# Altium schematic symbol library Schlib.SchLib: 725 symbols (part 5 of 6) (continued)
## S14B-XADSS-N(LF)(SN)
designator J?  (value not drawn)
ShroudedHeader, Side Entry, 14Circuit, 2.5mmPitch; Manufacturer: JST; Manufacturer Part Number: S14B-XADSS-N(LF)(SN); Number of Positions: 14; Connector Type: Header; Voltage Rating: 250V; Supplier: Digi-Key; Supplier Part Number: 455-2034-ND; RoHS: Yes; Category: Headers and Wire Housings; Pricing: 1=1.94, 10=1.69, 100=1.5104, 500=1.25864, 1000=1.07883, 5000=0.95656, 10000=0.93499 (USD); Mounting Technology: Through Hole; Contact Material: Copper Alloy; Contact Shape: Circular; Contact Finish - Mating: TIN; Insulation Material: Nylon; Insulation Color: Natural; Min Operating Temperature: -25°C; Max Operating Temperature: 85°C; Number of Rows: 2; Fastening Type: Ramp; Packaging: Bulk; Termination: Solder; Series: XAD; Contact Type: Male Pin; Flammability Rating: UL94 V-0; ComponentLink1URL: https://datasheet.ciiva.com/726/exad1-726146.pdf?src-supplier=Digi-Key; ComponentLink1Description: https://datasheet.ciiva.com/726/exad1-726146.pdf?src-supplier=Digi-Key
footprint S14B-XADSS-N
pins: 1, 2, 3, 4, 5, 6, 7, 8, 9, 10, 11, 12, 13, 14

## SBRT5A50SA-13
designator D?  (value not drawn)
Diode Super Barrier Rectifier 50V 5A 2-Pin SMA T/R; Manufacturer: Diodes; Manufacturer Part Number: SBRT5A50SA-13; Forward Voltage: 460mV; Max Forward Surge Current (Ifsm): 70A; Max Reverse Current: 45mA; Supplier: Future Electronics; Supplier Part Number: 2052284; RoHS: Yes; Category: Rectifier Diodes; Stock: 310000; Pricing: 5000=0.114, 10000=0.112, 15000=0.11, 20000=0.109 (USD); Mounting Technology: Surface Mount; Case/Package: SMA; Weight: 0.002258oz; Min Operating Temperature: -55°C; Max Operating Temperature: 150°C; Packaging: Tape and Reel; Average Rectified Current: 5A; Max Repetitive Reverse Voltage (Vrrm): 50V; Package Quantity: 5000; Max Reverse Voltage (DC): 50V; Series: TrenchSBR; Forward Current: 5A; Height: 2.4mm; Lead Free: Lead Free; RoHS Compliant: Yes; ComponentLink1URL: http://www.farnell.com/datasheets/2814462.pdf?src-supplier=Farnell; ComponentLink1Description: http://www.farnell.com/datasheets/2814462.pdf?src-supplier=Farnell; ComponentLink2URL: https://www.diodes.com/assets/Datasheets/SBRT5A50SA.pdf?src-supplier=Digikey; ComponentLink2Description: https://www.diodes.com/assets/Datasheets/SBRT5A50SA.pdf?src-supplier=Digikey; ComponentLink3URL: http://www.farnell.com/datasheets/2814462.pdf?src-supplier=Newark; ComponentLink3Description: http://www.farnell.com/datasheets/2814462.pdf?src-supplier=Newark; ComponentLink4URL: https://datasheet.octopart.com/SBRT5A50SA-13-Diodes-Inc.-datasheet-141417846.pdf?src-supplier=Future+Electronics; ComponentLink4Description: https://datasheet.octopart.com/SBRT5A50SA-13-Diodes-Inc.-datasheet-141417846.pdf?src-supplier=Future+Electronics; ComponentLink5URL: http://www.farnell.com/datasheets/2814462.pdf?src-supplier=Element14; ComponentLink5Description: http://www.farnell.com/datasheets/2814462.pdf?src-supplier=Element14; ComponentLink6URL: https://www.diodes.com/assets/Datasheets/SBRT5A50SA.pdf?src-supplier=Mouser; ComponentLink6Description: https://www.diodes.com/assets/Datasheets/SBRT5A50SA.pdf?src-supplier=Mouser; ComponentLink7URL: https://www.diodes.com/assets/Datasheets/SBRT5A50SA.pdf?src-supplier=Avnet; ComponentLink7Description: https://www.diodes.com/assets/Datasheets/SBRT5A50SA.pdf?src-supplier=Avnet; ComponentLink8URL: https://www.diodes.com/assets/Datasheets/SBRT5A50SA.pdf?src-supplier=Arrow+Electronics; ComponentLink8Description: https://www.diodes.com/assets/Datasheets/SBRT5A50SA.pdf?src-supplier=Arrow+Electronics; ComponentLink9URL: https://www.diodes.com/assets/Datasheets/SBRT5A50SA.pdf?src-supplier=Verical; ComponentLink9Description: https://www.diodes.com/assets/Datasheets/SBRT5A50SA.pdf?src-supplier=Verical
footprint DO-214AC, SMA
pins: 1 C, 2 A

## SESD0402X1UN-0020-090
designator D?
Part Number: SESD0402X1UN-0020-090
footprint SESD0402X1UN-0020-090
pins: A, C

## SFW15R-1STE1LF
designator J?  (value not drawn)
Conn FFC/FPC Connector SKT 15 POS 1mm Solder RA SMD Embossed T/R; Manufacturer: Amphenol ICC / FCI; Manufacturer Part Number: SFW15R-1STE1LF; Supplier: Newark; Supplier Part Number: 29AK7264; RoHS: No; Category: FFC / FPC; ComponentLink1URL: http://portal.fciconnect.com/Comergent/fci/drawing/sfw12lf.pdf?src-supplier=Mouser; ComponentLink1Description: http://portal.fciconnect.com/Comergent/fci/drawing/sfw12lf.pdf?src-supplier=Mouser; ComponentLink2URL: http://components.arrow.com/part/dataview/41915029S8554886N8314?src-supplier=Arrow+Electronics; ComponentLink2Description: http://components.arrow.com/part/dataview/41915029S8554886N8314?src-supplier=Arrow+Electronics; ComponentLink3URL: https://cdn.amphenol-icc.com/media/wysiwyg/files/drawing/sfw12lf.pdf?src-supplier=Digi-Key; ComponentLink3Description: https://cdn.amphenol-icc.com/media/wysiwyg/files/drawing/sfw12lf.pdf?src-supplier=Digi-Key; ComponentLink4URL: http://portal.fciconnect.com/Comergent//fci/drawing/sfw12lf.pdf?src-supplier=Digi-Key; ComponentLink4Description: http://portal.fciconnect.com/Comergent//fci/drawing/sfw12lf.pdf?src-supplier=Digi-Key; ComponentLink5URL: http://portal.fciconnect.com/Comergent/fci/drawing/sfw12lf.pdf?src-supplier=Avnet; ComponentLink5Description: http://portal.fciconnect.com/Comergent/fci/drawing/sfw12lf.pdf?src-supplier=Avnet
footprint SFW15R-1STE1LF
pins: 1, 2, 3, 4, 5, 6, 7, 8, 9, 10, 11, 12, 13, 14, 15, S1 SHIELD, S2 SHIELD

## SI1024X-T1-GE3
designator Q?  (value not drawn)
Transistor MOSFET Array Dual N-CH 20V 485mA 6-Pin SOT-563 T/R; Manufacturer: Vishay Siliconix; Manufacturer Part Number: SI1024X-T1-GE3; Rds On Max: 700mR; Max Power Dissipation: 250mW; Gate to Source Voltage (Vgs): 6V; Number of Elements: 2; Threshold Voltage: 450mV; Number of Channels: 1; FET Type: 2 N-Channel; Polarity: N-CHANNEL; Supplier: Digi-Key; Supplier Part Number: SI1024X-T1-GE3CT-ND; RoHS: Yes; Category: MOSFETs; Stock: 159002; Pricing: 1=0.55000, 10=0.47200, 100=0.35280, 500=0.27720, 1000=0.21420 (USD); Mounting Technology: Surface Mount; Case/Package: SOT-563-6; Pins: 89; Weight: 0.000289oz; Contact Plating: Tin,Matte; Min Operating Temperature: -55°C; Max Operating Temperature: 150°C; Package Quantity: 3000; Packaging: Tape and Reel; Drain to Source Voltage (Vdss): 20V; Continuous Drain Current (ID): 485mA; Drain to Source Breakdown Voltage: 20V; Drain to Source Resistance: 700mR; Power Dissipation: 250mW; Element Configuration: Dual; On-State Resistance: 700mR; Series: TrenchFET®; Drain-source On Resistance-Max: 700mR; Length: 1.7mm; Width: 1.2mm; Height: 0.6mm; Radiation Hardening: No; Lead Free: Lead Free; RoHS Compliant: Yes; ComponentLink1URL: https://datasheet.ciiva.com/1253/71170-1253313.pdf?src-supplier=Newark; ComponentLink1Description: https://datasheet.ciiva.com/1253/71170-1253313.pdf?src-supplier=Newark; ComponentLink2URL: https://datasheet.ciiva.com/6388/71170-6388105.pdf?src-supplier=Digi-Key; ComponentLink2Description: https://datasheet.ciiva.com/6388/71170-6388105.pdf?src-supplier=Digi-Key; ComponentLink3URL: https://datasheet.ciiva.com/6388/71170-6388154.pdf?src-supplier=Digi-Key; ComponentLink3Description: https://datasheet.ciiva.com/6388/71170-6388154.pdf?src-supplier=Digi-Key; ComponentLink4URL: https://datasheet.ciiva.com/11161/71170-11161434.pdf?src-supplier=Avnet; ComponentLink4Description: https://datasheet.ciiva.com/11161/71170-11161434.pdf?src-supplier=Avnet; ComponentLink5URL: https://datasheet.ciiva.com/6388/71170-6388155.pdf?src-supplier=Digi-Key; ComponentLink5Description: https://datasheet.ciiva.com/6388/71170-6388155.pdf?src-supplier=Digi-Key
footprint SC-89 (SOT-563F)
pins: 1 S1, 2 G1, 3 D2, 4 S2, 5 G2, 6 D1

## SI7611DN-T1-GE3
designator Q?  (value not drawn)
P-Channel 40 V 0.025 Ohm 39 W Surface Mount Power Mosfet - PowerPAK-1212-8; Manufacturer: Vishay Siliconix; Manufacturer Part Number: SI7611DN-T1-GE3; Supplier: Digikey; Supplier Part Number: SI7611DN-T1-GE3CT-ND; RoHS: Yes; Category: MOSFETs; Stock: 9291; Pricing: 1=2.37, 10=1.521, 100=1.0368, 500=0.82974, 1000=0.76314 (USD); ComponentLink1URL: https://datasheet.ciiva.com/4441/si7611dn-244617-4441134.pdf?src-supplier=Mouser; ComponentLink1Description: https://datasheet.ciiva.com/4441/si7611dn-244617-4441134.pdf?src-supplier=Mouser; ComponentLink2URL: https://datasheet.ciiva.com/22652/1719651-22652413.pdf?src-supplier=Element14; ComponentLink2Description: https://datasheet.ciiva.com/22652/1719651-22652413.pdf?src-supplier=Element14; ComponentLink3URL: https://datasheet.ciiva.com/16217/si7611dn-16217425.pdf?src-supplier=Future+Electronics; ComponentLink3Description: https://datasheet.ciiva.com/16217/si7611dn-16217425.pdf?src-supplier=Future+Electronics; ComponentLink4URL: https://datasheet.ciiva.com/22671/si7611dn-22671641.pdf?src-supplier=Element14; ComponentLink4Description: https://datasheet.ciiva.com/22671/si7611dn-22671641.pdf?src-supplier=Element14; ComponentLink5URL: https://datasheet.ciiva.com/933/si7611dn-933572.pdf?src-supplier=Digikey; ComponentLink5Description: https://datasheet.ciiva.com/933/si7611dn-933572.pdf?src-supplier=Digikey; ComponentLink6URL: https://datasheet.ciiva.com/933/si7611dn-933573.pdf?src-supplier=Digikey; ComponentLink6Description: https://datasheet.ciiva.com/933/si7611dn-933573.pdf?src-supplier=Digikey; ComponentLink7URL: https://datasheet.ciiva.com/933/si7611dn-933574.pdf?src-supplier=Digikey; ComponentLink7Description: https://datasheet.ciiva.com/933/si7611dn-933574.pdf?src-supplier=Digikey; ComponentLink8URL: https://datasheet.ciiva.com/11159/si7611dn-11159816.pdf?src-supplier=Avnet; ComponentLink8Description: https://datasheet.ciiva.com/11159/si7611dn-11159816.pdf?src-supplier=Avnet
footprint PowerPAK 1212-8
pins: 1 S, 2 S, 3 S, 4 G, 5 D, 6 D, 7 D, 8 D

## SI7617DN-T1-GE3
designator Q?  (value not drawn)
P CHANNEL MOSFET, -30V, 35A; Transistor; Transistor Polarity: P Channel; Continuous Drain Current Id: -35A; Source; Manufacturer: Vishay Siliconix; Manufacturer Part Number: SI7617DN-T1-GE3; Rise Time: 43ns; Rds On Max: 12.3mR; Input Capacitance: 1.8nF; Gate to Source Voltage (Vgs): 25V; Max Power Dissipation: 52W; Fall Time: 11ns; Turn-Off Delay Time: 30ns; Number of Elements: 1; Power Dissipation: 3.7W; Threshold Voltage: -2.5V; Turn-On Delay Time: 40ns; Polarity: P-CHANNEL; Supplier: Mouser; Supplier Part Number: 781-SI7617DN-GE3; RoHS: Yes; Category: MOSFETs; Stock: 19113; Pricing: 1=0.85, 10=0.695, 50=0.695, 100=0.541, 1000=0.374, 10000=0.32 (USD); Mounting Technology: Surface Mount; Pins: 8; Min Operating Temperature: -55°C; Max Operating Temperature: 150°C; Packaging: Tape and Reel; Package Quantity: 3000; Drain to Source Resistance: 12.3mR; Drain to Source Voltage (Vdss): -30V; Continuous Drain Current (ID): -35A; Number of Channels: 1; Series: TrenchFET®; Radiation Hardening: No; Reach SVHC Compliant: No; Lead Free: Lead Free; RoHS Compliant: Yes; ComponentLink1URL: https://datasheet.ciiva.com/11159/si7617dn-11159822.pdf?src-supplier=Avnet; ComponentLink1Description: https://datasheet.ciiva.com/11159/si7617dn-11159822.pdf?src-supplier=Avnet
footprint SI7617DN-T1-GE3
pins: 1 S, 2 S, 3 S, 4 G, 5 D

## SIC438BED-T1-GE3
designator U?  (value not drawn)
Synchronous Buck Regulator Power Saving 28V I/P Adjustable O/P 8A 24-Pin PowerPAK MLP44 T/R; Manufacturer: Vishay Siliconix; Manufacturer Part Number: SIC438BED-T1-GE3; Output Configuration: Positive; Number of Outputs: 1; Min Input Voltage: 3V; Min Output Voltage: 600mV; Max Output Voltage: 20V; Switching Frequency: 1MHz; Synchronous Rectifier: Yes; Supplier: Digi-Key; Supplier Part Number: SIC438BED-T1-GE3CT-ND; RoHS: Yes; Category: Voltage Regulators - Switching; Stock: 19616; Pricing: 1=2.88000, 10=2.58400, 25=2.43800, 100=2.07720, 250=1.95040, 500=1.70660, 1000=1.51800 (USD); Mounting Technology: Surface Mount; Pins: 24; Min Operating Temperature: -40°C; Max Operating Temperature: 125°C; Output Type: Adjustable; Packaging: Cut Tape; Max Supply Voltage: 28V; Output Current: 8A; ComponentLink1URL: http://www.vishay.com/docs/75921/sic437.pdf?src-supplier=Digi-Key; ComponentLink1Description: http://www.vishay.com/docs/75921/sic437.pdf?src-supplier=Digi-Key
footprint SIC438BED-T1-GE3
pins: 1 VIN, 2 VIN, 3 PGND, 4 PGND, 5 SW, 6 SW, 7 SW, 8 SW, 9 SW, 10 GL, 11 GL, 12 VDRV, 13 PGND, 14 PGOOD, 15 VDD, 16 AGND, 17 FB, 18 VOUT, 19 EN, 20 MODE2, 21 MODE1, 22 VIN, 23 BOOT, 24 PHASE, 25 AGND_PAD, 26 VIN_PAD, 27 PGND_PAD, 28 GL, 29 PGND_PAD, 30 SW

## SIC461ED-T1-GE3
designator U?  (value not drawn)
Synchronous Buck Regulator 10 A 2 MHz 4.5 V to 60 V I/P Adjustable 0.8 V to 55.2 V O/P PowerPAK MLP 55-27L; Manufacturer: Vishay; Manufacturer Part Number: SIC461ED-T1-GE3; Output Configuration: Positive; Number of Outputs: 1; Min Input Voltage: 4.5V; Max Supply Voltage: 60V; Min Output Voltage: 800mV; Max Output Voltage: 55.2V; Output Current: 10A; Switching Frequency: 2MHz; Synchronous Rectifier: Yes; Supplier: Mouser; Supplier Part Number: 78-SIC461ED-T1-GE3; RoHS: Yes; Category: Voltage Regulators - Switching; Stock: 11112; Pricing: 1=5.36, 10=4.55, 50=4.55, 100=3.95, 1000=2.83, 10000=2.65 (USD); Mounting Technology: Surface Mount; Min Operating Temperature: -40°C; Max Operating Temperature: 125°C; Output Type: Adjustable; Packaging: Cut Tape; Series: -; RoHS Compliant: Yes; ComponentLink1URL: http://www.vishay.com/docs/65124/sic46x.pdf?src-supplier=Digikey; ComponentLink1Description: http://www.vishay.com/docs/65124/sic46x.pdf?src-supplier=Digikey
pins: 1 VCIN, 2 PGOOD, 3 EN, 4 BOOT, 5 PHASE, 6 PHASE, 7 VIN, 8 VIN, 9 PGND, 10 PGND, 11 PGND, 12 SW, 13 SW, 14 SW, 14.1 SW, 15 GL, 16 VDRV, 17 PGND, 18 ULTRASONIC, 19 SS, 20 VSNS, 21 COMP, 22 VFB, 23 AGND, 24 FSW, 25 ILIMIT, 26 VDD, 27 MODE, 28 AGND, 29 VIN, 30.1 PGND, 30.2 PGND

## SIC466ED-T1-GE3
designator *
4.5 - 60V input, 10A microBUCK with Internal compensation, 120 A quiescent current; Manufacturer: Vishay; Manufacturer Part Number: SIC466ED-T1-GE3; Output Type: Adjustable; Output Configuration: Positive; Number of Outputs: 1; Min Input Voltage: 4.5V; Min Output Voltage: 800mV; Max Output Voltage: 55.2V; Switching Frequency: 2MHz; Synchronous Rectifier: Yes; Supplier: Mouser; Supplier Part Number: 78-SIC466ED-T1-GE3; RoHS: Yes; Category: DSPs - Digital Signal Processors; Stock: 4498; Pricing: 1=5.88, 10=5, 50=5, 100=4.33, 1000=3.11, 10000=2.85 (USD); Mounting Technology: Surface Mount; Min Operating Temperature: -40°C; Max Operating Temperature: 105°C; Series: microBUCK®; Packaging: Cut Tape; Max Supply Voltage: 60V; Output Current: 10A; RoHS Compliant: Yes; ComponentLink1URL: https://datasheet.octopart.com/SIC466ED-T1-GE3-Vishay-datasheet-156007658.pdf?src-supplier=Future+Electronics; ComponentLink1Description: https://datasheet.octopart.com/SIC466ED-T1-GE3-Vishay-datasheet-156007658.pdf?src-supplier=Future+Electronics; ComponentLink2URL: http://www.vishay.com/docs/76044/sic46x.pdf?src-supplier=Digikey; ComponentLink2Description: http://www.vishay.com/docs/76044/sic46x.pdf?src-supplier=Digikey

## SIP32408DNP-T1-GE4
designator U?  (value not drawn)
SWITCH, SLEW CNTRL, 5.5V, 3.5A, 4TDFN; Power Load Switch Type: High Side; Input V; Manufacturer: Vishay Siliconix; Manufacturer Part Number: SIP32408DNP-T1-GE4; Number of Outputs: 1; Max Power Dissipation: 735mW; Min Supply Voltage: 1.1V; Interface: On/Off; On-State Resistance: 44mR; Fault Protection: Reverse Current; Supplier: Mouser; Supplier Part Number: 78-SIP32408DNP-GE4; RoHS: Yes; Category: Hot Swap Controllers; Stock: 31306; Pricing: 1=0.61, 10=0.488, 50=0.488, 100=0.363, 1000=0.237, 10000=0.188 (USD); Mounting Technology: Surface Mount; Pins: 4; Weight: 0.001764oz; Min Operating Temperature: -40°C; Max Operating Temperature: 85°C; Package Quantity: 3000; Packaging: Tape and Reel; Output Current: 3.5A; Max Supply Voltage: 5.5V; Max Output current: 3.5A; Power Dissipation: 735mW; Output Configuration: High Side; Series: -; Lead Free: Lead Free; RoHS Compliant: Yes; Reach SVHC Compliant: Unknown; ComponentLink1URL: https://datasheet.ciiva.com/22629/1692703-22629056.pdf?src-supplier=Element14; ComponentLink1Description: https://datasheet.ciiva.com/22629/1692703-22629056.pdf?src-supplier=Element14; ComponentLink2URL: https://datasheet.ciiva.com/12186/sip32408-244424-12186651.pdf?src-supplier=Mouser; ComponentLink2Description: https://datasheet.ciiva.com/12186/sip32408-244424-12186651.pdf?src-supplier=Mouser
footprint SIP32408DNP-T1-GE4
pins: 1 IN, 2 GND, 3 EN, 4 OUT, 5 GND

## SIS412DN-T1-GE3
designator Q?  (value not drawn)
SiS412DN Series N-Channel 30 V 24 mOhms SMT Power Mosfet - PowerPAK-1212-8; Manufacturer: Vishay Siliconix; Manufacturer Part Number: SIS412DN-T1-GE3; Rise Time: 12ns; Rds On Max: 24mR; Input Capacitance: 435pF; Nominal Vgs: 1V; Drain to Source Voltage (Vdss): 30V; Continuous Drain Current (ID): 12A; Max Power Dissipation: 15.6W; Gate to Source Voltage (Vgs): 20V; Fall Time: 10ns; Turn-Off Delay Time: 15ns; Number of Channels: 1; Supplier: Mouser; Supplier Part Number: 781-SIS412DN-T1-GE3; RoHS: Yes; Category: MOSFETs; Stock: 10524; Pricing: 1=0.57, 10=0.492, 50=0.492, 100=0.358, 1000=0.243, 10000=0.215 (USD); Mounting Technology: Surface Mount; Pins: 8; Min Operating Temperature: -55°C; Max Operating Temperature: 150°C; Package Quantity: 1; Packaging: Tape and Reel; Drain to Source Resistance: 24mR; Threshold Voltage: 1V; Turn-On Delay Time: 15ns; Polarity: N-CHANNEL; Series: TrenchFET®; Drain-source On Resistance-Max: 24MR; Length: 3.05mm; Width: 3.05mm; Height: 1.04mm; Radiation Hardening: No; Lead Free: Lead Free; RoHS Compliant: Yes; Reach SVHC Compliant: Unknown; ComponentLink1URL: https://datasheet.ciiva.com/6367/sis412dn-6367073.pdf?src-supplier=Digikey; ComponentLink1Description: https://datasheet.ciiva.com/6367/sis412dn-6367073.pdf?src-supplier=Digikey; ComponentLink2URL: https://datasheet.ciiva.com/23729/1758800-23729781.pdf?src-supplier=Newark; ComponentLink2Description: https://datasheet.ciiva.com/23729/1758800-23729781.pdf?src-supplier=Newark; ComponentLink3URL: https://datasheet.ciiva.com/8059/sis412dn-8059196.pdf?src-supplier=Element14; ComponentLink3Description: https://datasheet.ciiva.com/8059/sis412dn-8059196.pdf?src-supplier=Element14; ComponentLink4URL: https://datasheet.ciiva.com/16486/sis412dn-16486863.pdf?src-supplier=Future+Electronics; ComponentLink4Description: https://datasheet.ciiva.com/16486/sis412dn-16486863.pdf?src-supplier=Future+Electronics; ComponentLink5URL: https://datasheet.ciiva.com/6367/sis412dn-6367070.pdf?src-supplier=Digikey; ComponentLink5Description: https://datasheet.ciiva.com/6367/sis412dn-6367070.pdf?src-supplier=Digikey; ComponentLink6URL: https://datasheet.ciiva.com/6367/sis412dn-6367077.pdf?src-supplier=Digikey; ComponentLink6Description: https://datasheet.ciiva.com/6367/sis412dn-6367077.pdf?src-supplier=Digikey
footprint SIS412DN-T1-GE3
pins: 1 S, 2 S, 3 S, 4 G, 5 D

## SK34A
designator D?  (value not drawn)
Rectifier, Schottky, 3A, 40V, DO-214AC (SMA); Manufacturer: Taiwan Semiconductor; Manufacturer Part Number: SK34A; Element Configuration: Single; Forward Voltage: 550mV; Max Forward Surge Current (Ifsm): 70A; Max Reverse Leakage Current: 500uA; Supplier: Mouser; Supplier Part Number: 821-SK34A; RoHS: Yes; Category: Uncategorized; Stock: 11617; Pricing: 1=0.42000, 10=0.34000, 50=0.34000, 100=0.27300, 1000=0.27300, 10000=0.11700 (USD); Case/Package: SMA; Pins: 2; Min Operating Temperature: -55°C; Max Operating Temperature: 125°C; Packaging: Tape and Reel; Max Repetitive Reverse Voltage (Vrrm): 40V; Forward Current: 3A; Package Quantity: 7500; Max Surge Current: 70A; RoHS Compliant: Yes; Reach SVHC Compliant: Yes; ComponentLink1URL: https://datasheet.ciiva.com/5762/51635-5762838.pdf?src-supplier=Farnell; ComponentLink1Description: https://datasheet.ciiva.com/5762/51635-5762838.pdf?src-supplier=Farnell; ComponentLink2URL: https://datasheet.ciiva.com/7962/51635-7962571.pdf?src-supplier=Element14; ComponentLink2Description: https://datasheet.ciiva.com/7962/51635-7962571.pdf?src-supplier=Element14; ComponentLink3URL: https://datasheet.ciiva.com/7962/51635-7962570.pdf?src-supplier=Element14; ComponentLink3Description: https://datasheet.ciiva.com/7962/51635-7962570.pdf?src-supplier=Element14
footprint DO-214AC, SMA
pins: 1 C, 2 A

## SLW-166261-4A-RA-N-D
designator SW?
16.5 x 6.2 x 6.1 mm, 4 mm Raised Slide Actuator, Right Angle, Through Hole, Slide Switch; Manufacturer: Same Sky; Manufacturer Part Number: SLW-166261-4A-RA-N-D; Number of Positions: 3; Supplier: Mouser; Supplier Part Number: 179-SLW1662614ARAND; RoHS: Compliant; Category: Slide Switches; Stock: 3177; Pricing: 1=0.54, 10=0.518, 50=0.499, 100=0.432, 1000=0.348, 10000=0.298 (USD); Export Control Classification Number (ECCN) Code: EAR99; Harmonized Tariff Schedule (HTS) Code: 8536.50.70.00; Introduction Date: 2024-11-07; Lifecycle Status: Production; ComponentLink1URL: https://datasheet.octopart.com:443/SLW-166261-4A-RA-N-D-Same-Sky-datasheet-188843292.pdf?src-supplier=Electro+Sonic; ComponentLink1Description: https://datasheet.octopart.com:443/SLW-166261-4A-RA-N-D-Same-Sky-datasheet-188843292.pdf?src-supplier=Electro+Sonic; ComponentLink2URL: https://datasheet.octopart.com:443/SLW-166261-4A-RA-N-D-Same-Sky-datasheet-192884159.pdf?src-supplier=Farnell; ComponentLink2Description: https://datasheet.octopart.com:443/SLW-166261-4A-RA-N-D-Same-Sky-datasheet-192884159.pdf?src-supplier=Farnell; ComponentLink3URL: https://datasheet.octopart.com:443/SLW-166261-4A-RA-N-D-Same-Sky-datasheet-181919708.pdf?src-supplier=Same+Sky; ComponentLink3Description: https://datasheet.octopart.com:443/SLW-166261-4A-RA-N-D-Same-Sky-datasheet-181919708.pdf?src-supplier=Same+Sky; ComponentLink4URL: https://datasheet.octopart.com:443/SLW-166261-4A-RA-N-D-Same-Sky-datasheet-187907069.pdf?src-supplier=Master+Electronics; ComponentLink4Description: https://datasheet.octopart.com:443/SLW-166261-4A-RA-N-D-Same-Sky-datasheet-187907069.pdf?src-supplier=Master+Electronics; ComponentLink5URL: https://datasheet.octopart.com:443/SLW-166261-4A-RA-N-D-Same-Sky-datasheet-188930918.pdf?src-supplier=TME; ComponentLink5Description: https://datasheet.octopart.com:443/SLW-166261-4A-RA-N-D-Same-Sky-datasheet-188930918.pdf?src-supplier=TME; ComponentLink6URL: https://datasheet.octopart.com:443/SLW-166261-4A-RA-N-D-CUI-Devices-datasheet-179746715.pdf?src-supplier=TME; ComponentLink6Description: https://datasheet.octopart.com:443/SLW-166261-4A-RA-N-D-CUI-Devices-datasheet-179746715.pdf?src-supplier=TME; ComponentLink7URL: https://octopart.com:443/opatz8j6/c1?t=aa_y8OcgiqQrusNSdiFUNPSqHMoNR-mmO6jvzALhgaLK5JgwzTA5kpIZ_BF6SIoAkBHrl7d19WHuT8sybLdudKvKiI-hR0gcjJee-8FcKbbBOYZHoZqOakR3OHMUwDLIKyS-VwI_3HyUIzwM1Ab63uWjLLRVQxXaHQztaKGuyb_sprOcezcZMuVibEkpVVon3vy9x0oOcVNJNkq-XBgKaTY-Vfjn9tBq_eWc6IFpG99pE0flz8w-wNhs3AVGEn3LOm2NE6Up1PQ2lV55f3d16jLE7kGOtc-D26eg4RWuV0X0_yCBkWL_ViIgBu1v8Z7KY2m1ye96B6Q7BCajjy9_LOusT7uCYWaxdRpHF6VQQaP7wAQkmg&src-supplier=Compliance+Statements; ComponentLink7Description: https://octopart.com:443/opatz8j6/c1?t=aa_y8OcgiqQrusNSdiFUNPSqHMoNR-mmO6jvzALhgaLK5JgwzTA5kpIZ_BF6SIoAkBHrl7d19WHuT8sybLdudKvKiI-hR0gcjJee-8FcKbbBOYZHoZqOakR3OHMUwDLIKyS-VwI_3HyUIzwM1Ab63uWjLLRVQxXaHQztaKGuyb_sprOcezcZMuVibEkpVVon3vy9x0oOcVNJNkq-XBgKaTY-Vfjn9tBq_eWc6IFpG99pE0flz8w-wNhs3AVGEn3LOm2NE6Up1PQ2lV55f3d16jLE7kGOtc-D26eg4RWuV0X0_yCBkWL_ViIgBu1v8Z7KY2m1ye96B6Q7BCajjy9_LOusT7uCYWaxdRpHF6VQQaP7wAQkmg&src-supplier=Compliance+Statements; ComponentLink8URL: https://octopart.com:443/opatz8j6/c1?t=YI7t5mNvtuXjDcOstTUyF6OWRrNBAUGuBsGh_GXlLUFA6v8CMP-hei9ZOLKUw6M8nx5WDvOfrdfi63kpw4-zJax7FYh7LXEVy11j_tCrOAw7h2Tz2l8ORNQNLmOmM8IEk6no3WHpO3dGkhoEkZRgFRjw8ayhaABd2RucbTbxLx2AFUM4_docFIwQRNbMrLygTaUnAmWozFATMa4uea5_xuXEa7B9a8KPoRoWVdqXB3tV2LiehXcQb5yuWeBiACWZ7VE35s6WuEDzLFJ8DvVloChu59vNe6i7UWkRUKymQv58iZmBWBlwiR05kGZDHMLxQe9c15x_wZycH3PRNTYe4sLZ8M7BAsTJzklIlHiuIbie5kQ8xw&src-supplier=Compliance+Statements; ComponentLink8Description: https://octopart.com:443/opatz8j6/c1?t=YI7t5mNvtuXjDcOstTUyF6OWRrNBAUGuBsGh_GXlLUFA6v8CMP-hei9ZOLKUw6M8nx5WDvOfrdfi63kpw4-zJax7FYh7LXEVy11j_tCrOAw7h2Tz2l8ORNQNLmOmM8IEk6no3WHpO3dGkhoEkZRgFRjw8ayhaABd2RucbTbxLx2AFUM4_docFIwQRNbMrLygTaUnAmWozFATMa4uea5_xuXEa7B9a8KPoRoWVdqXB3tV2LiehXcQb5yuWeBiACWZ7VE35s6WuEDzLFJ8DvVloChu59vNe6i7UWkRUKymQv58iZmBWBlwiR05kGZDHMLxQe9c15x_wZycH3PRNTYe4sLZ8M7BAsTJzklIlHiuIbie5kQ8xw&src-supplier=Compliance+Statements
footprint SW_SLW-166261-4A-RA-N-D
pins: 1, 2, 3, 4, 5 SH1, 6 SH2

## SM3ZS067U215AMR1500
designator J?  (value not drawn)
Conn Edge Sgl Female 67POS 0.020; Manufacturer: JAE Electronics; Manufacturer Part Number: SM3ZS067U215AMR1500; Supplier: Digi-Key; Supplier Part Number: SM3ZS067U215AMR1500-ND; RoHS: Yes; Category: Card Edge Connectors; Pricing: 2250000=0.95948 (USD); ComponentLink1URL: http://www.jae.com/z-en/pdf_download_exec.cfm?param=MB-0261-4E_SM3.pdf&src-supplier=Digi-Key; ComponentLink1Description: http://www.jae.com/z-en/pdf_download_exec.cfm?param=MB-0261-4E_SM3.pdf&src-supplier=Digi-Key
footprint SM3ZS067U215AMR1500
pins: 1 GND, 2 3V3, 3 GND, 4 3V3, 5 PER3_N, 6 N/C, 7 PER3_P, 8 N/C, 9 GND, 10 LED, 11 PET3_N, 12 3V3, 13 PET3_P, 14 3V3, 15 GND, 16 3V3, 17 PER2_N, 18 3V3, 19 PER2_P, 20 N/C, 21 GND, 22 N/C, 23 PET2_N, 24 N/C, 25 PET2_P, 26 N/C, 27 GND, 28 N/C, 29 PER1_N, 30 N/C, 31 PER1_P, 32 N/C, 33 GND, 34 N/C, 35 PET1_N, 36 N/C, 37 PET1_P, 38 N/C, 39 GND, 40 SMB_CLK, 41 PER0_N, 42 SMB_DATA, 43 PER0_P, 44 ALERT*, 45 GND, 46 N/C, 47 PET0_N, 48 N/C, 49 PET0_P, 50 PERST#, 51 GND, 52 CLKREQ#, 53 REFCLK_N, 54 PEWAK#, 55 REFCLK_P, 56 N/C, 57 GND, 58 N/C, 67 N/C, 68 SUSCLK(32KHz), 69 N/C, 70 3V3, 71 GND, 72 3V3, 73 GND, 74 3V3, 75 GND, S1 MNT1, S2 MNT2
text: M.2 KEY M

## SM04B-GHS-TB(LF)(SN)
designator J?  (value not drawn)
Connector Header, GH Series, 4 Position, 1.25mm, 30-26 AWG, 50V, Surface Mount, Right Angle, Solder, Locking Ramp; Manufacturer: JST; Manufacturer Part Number: SM04B-GHS-TB(LF)(SN); Number of Positions: 4; Current Rating: 1A; Supplier: Rs; Supplier Part Number: 7521797P; RoHS: Yes; Category: Headers and Wire Housings; Stock: 24280; Pricing: 125=0.07680, 500=0.34200, 2500=0.31800, 5000=0.30400 (GBP); Mounting Technology: Surface Mount; Contact Plating: Tin; Contact Material: Bronze; Housing Color: Natural; Housing Material: Nylon; Number of Rows: 1; Termination: Solder; Packaging: Cut Tape; Voltage Rating: 50V; Number of Contacts: 4; Orientation: Right Angle; Series: GH; Pitch: 1.25mm; Reach SVHC Compliant: Yes; Lead Free: Lead Free; ComponentLink1URL: https://datasheet.ciiva.com/25617/0900766b810cef18-25617294.pdf?src-supplier=Rs; ComponentLink1Description: https://datasheet.ciiva.com/25617/0900766b810cef18-25617294.pdf?src-supplier=Rs; ComponentLink2URL: https://datasheet.ciiva.com/8052/5438-8052266.pdf?src-supplier=Element14; ComponentLink2Description: https://datasheet.ciiva.com/8052/5438-8052266.pdf?src-supplier=Element14
footprint SM04B-GHS-TB(LF)(SN)- (JST)
pins: 1, 2, 3, 4, S1 SHIELD (power), S2 SHIELD (power)
text: 90'

## SM06B-GHS-TB(LF)(SN)
designator J?  (value not drawn)
CONN HEADER GH SIDE 6POS 1.25MM; Manufacturer: JST; Manufacturer Part Number: SM06B-GHS-TB(LF)(SN); Supplier: Rs; Supplier Part Number: 7521800P; RoHS: Yes; Category: Headers and Wire Housings; Stock: 17715; Pricing: 125=0.386, 500=0.362, 2500=0.334, 5000=0.318 (GBP); ComponentLink1URL: https://datasheet.ciiva.com/25617/0900766b810cef18-25617251.pdf?src-supplier=Rs; ComponentLink1Description: https://datasheet.ciiva.com/25617/0900766b810cef18-25617251.pdf?src-supplier=Rs; ComponentLink2URL: https://datasheet.ciiva.com/16487/jstsm06b-ghs-tb-lf-sn-16487196.pdf?src-supplier=Future+Electronics; ComponentLink2Description: https://datasheet.ciiva.com/16487/jstsm06b-ghs-tb-lf-sn-16487196.pdf?src-supplier=Future+Electronics
footprint SM06B-GHS-TB(LF)(SN)
pins: 1, 2, 3, 4, 5, 6, S1 SHIELD, S2 SHIELD

## SM08B-GHS-TB(LF)(SN)
designator J?  (value not drawn)
Connector Header, GH Series, 8 Position, 1.25mm, 30-26 AWG, 50V, Surface Mount, Right Angle, Solder, Locking Ramp; Manufacturer: JST; Manufacturer Part Number: SM08B-GHS-TB(LF)(SN); Supplier: Rs; Supplier Part Number: 7521804P; RoHS: Yes; Category: Connectors; Stock: 4065; Pricing: 125=0.596, 500=0.536, 2500=0.496, 5000=0.472 (GBP); ComponentLink1URL: https://datasheet.ciiva.com/25617/0900766b810cef18-25617249.pdf?src-supplier=Rs; ComponentLink1Description: https://datasheet.ciiva.com/25617/0900766b810cef18-25617249.pdf?src-supplier=Rs; ComponentLink2URL: https://datasheet.ciiva.com/16290/jst20sm08b-ghs-tb-lf-sn-16290511.pdf?src-supplier=Future+Electronics; ComponentLink2Description: https://datasheet.ciiva.com/16290/jst20sm08b-ghs-tb-lf-sn-16290511.pdf?src-supplier=Future+Electronics
footprint SM08B-GHS-TB
pins: 1, 2, 3, 4, 5, 6, 7, 8, S1 SHIELD, S2 SHIELD

## SM14B-GHS-TB
designator J?  (value not drawn)
Board Connector, 14 Contact(s), 1 Row(s), Male, Right Angle, Surface Mount Terminal; Manufacturer: JST; Manufacturer Part Number: SM14B-GHS-TB; Supplier: DigiKey; Supplier Part Number: 455-1576-1-ND; RoHS: Compliant; Category: Card Edge Connectors; Stock: 5236; Pricing: 1=0.66, 10=0.557, 100=0.4735, 500=0.42258, 1000=0.40239 (USD); Contact Gender: Male; Lifecycle Status: Obsolete; Pins: 14; Terminal Pitch: 1.25mm; ComponentLink1URL: https://datasheet.octopart.com:443/SM14B-GHS-TB-JST-datasheet-12527556.pdf?src-supplier=IHS; ComponentLink1Description: https://datasheet.octopart.com:443/SM14B-GHS-TB-JST-datasheet-12527556.pdf?src-supplier=IHS
footprint SM14B-GHS-TB
pins: 1, 2, 3, 4, 5, 6, 7, 8, 9, 10, 11, 12, 13, 14, S1 SHIELD, S2 SHIELD

## SM14B-NSHSS-TB(LF)(SN)
designator *
Board Connector, 14 Contact(s), 1 Row(s), Male, Right Angle, Surface Mount Terminal; Manufacturer: JST; Manufacturer Part Number: SM14B-NSHSS-TB(LF)(SN); Connector Type: Outer Shroud Contact; Contact Resistance: 50mΩ; Max Current Rating: 1A; Max Voltage Rating (AC): 50V; Number of Positions: 14; Pitch: 990.6µm; Supplier: DigiKey; Supplier Part Number: 455-2765-1-ND; RoHS: Compliant; Category: Card Edge Connectors; Stock: 3964; Pricing: 1=1.09, 10=0.927, 100=0.7874, 500=0.70276 (USD); Color: Natural; Contact Gender: Male; Contact Plating: Tin; Depth: 6.8mm; Fastening Type: Latch; Housing Color: Natural; Housing Material: Polyamide; Length: 16mm; Lifecycle Status: Production; Max Operating Temperature: 85°C; Min Operating Temperature: -25°C; Mounting Technology: Surface Mount; Pins: 14; Number of Rows: 1; Orientation: Right Angle; Packaging: Tape & Reel (TR); Terminal Pitch: 1mm; Termination: Solder; ComponentLink1URL: https://datasheet.octopart.com:443/SM14B-NSHSS-TB%28LF%29%28SN%29-JST-datasheet-180492081.pdf?src-supplier=IHS; ComponentLink1Description: https://datasheet.octopart.com:443/SM14B-NSHSS-TB%28LF%29%28SN%29-JST-datasheet-180492081.pdf?src-supplier=IHS; ComponentLink2URL: https://datasheet.octopart.com:443/SM14B-NSHSS-TB%28LF%29%28SN%29-JST-datasheet-12520362.pdf?src-supplier=Component+Distributors+Inc.; ComponentLink2Description: https://datasheet.octopart.com:443/SM14B-NSHSS-TB%28LF%29%28SN%29-JST-datasheet-12520362.pdf?src-supplier=Component+Distributors+Inc.; ComponentLink3URL: https://datasheet.octopart.com:443/SM14B-NSHSS-TB%28LF%29%28SN%29-JST-datasheet-137194328.pdf?src-supplier=Component+Distributors+Inc.; ComponentLink3Description: https://datasheet.octopart.com:443/SM14B-NSHSS-TB%28LF%29%28SN%29-JST-datasheet-137194328.pdf?src-supplier=Component+Distributors+Inc.
pins: 1, 2, 3, 4, 5, 6, 7, 8, 9, 10, 11, 12, 13, 14, S1 SHIELD, S2 SHIELD

## SM42P01EL
designator U?  (value not drawn)
Chip Lan Xfmr Module, 5Gbe, poe+, w Cmc / Tape & Reel - 13" Reel Rohs Compliant: Yes; Manufacturer: Bourns; Manufacturer Part Number: SM42P01EL; Supplier: Digi-Key; Supplier Part Number: 118-SM42P01ELCT-ND; RoHS: Yes; Stock: 800; Pricing: 1=2.61000, 10=2.09100, 25=1.69880, 50=1.65520, 100=1.61160, 250=1.56804 (USD)
footprint SM42P01EL
pins: 1 TCT1, 2 TD1+, 3 TD1-, 4 TCT2, 5 TD2+, 6 TD2-, 7 TCT3, 8 TD3+, 9 TD3-, 10 TCT4, 11 TD4+, 12 TD4-, 13 MX4-, 14 MX4+, 15 MCT4, 16 MX3-, 17 MX3+, 18 MCT3, 19 MX2-, 20 MX2+, 21 MCT2, 22 MX1-, 23 MX1+, 24 MCT1

## SMAJ5.0CA
designator D?  (value not drawn)
Transient Voltage Suppressor, TVS, SMAJ Series, Bidirectional, 5 V, DO-214AC, 2, 6.4 V RoHS Compliant: Yes; Manufacturer: Bourns; Manufacturer Part Number: SMAJ5.0CA; Supplier: Rs; Supplier Part Number: 1742497P; RoHS: Yes; Category: TVS Diodes; Stock: 19500; Pricing: 100=0.229, 250=0.198, 500=0.178, 1000=0.13 (GBP); ComponentLink1URL: https://datasheet.ciiva.com/11336/smaj-11336795.pdf?src-supplier=Avnet; ComponentLink1Description: https://datasheet.ciiva.com/11336/smaj-11336795.pdf?src-supplier=Avnet; ComponentLink2URL: https://datasheet.ciiva.com/3022/smaj-3022286.pdf?src-supplier=Avnet; ComponentLink2Description: https://datasheet.ciiva.com/3022/smaj-3022286.pdf?src-supplier=Avnet; ComponentLink3URL: https://datasheet.ciiva.com/334/smaj-334522.pdf?src-supplier=Digi-Key; ComponentLink3Description: https://datasheet.ciiva.com/334/smaj-334522.pdf?src-supplier=Digi-Key; ComponentLink4URL: https://datasheet.ciiva.com/334/smaj-334523.pdf?src-supplier=Digi-Key; ComponentLink4Description: https://datasheet.ciiva.com/334/smaj-334523.pdf?src-supplier=Digi-Key; ComponentLink5URL: https://datasheet.ciiva.com/334/smaj-334524.pdf?src-supplier=Digi-Key; ComponentLink5Description: https://datasheet.ciiva.com/334/smaj-334524.pdf?src-supplier=Digi-Key; ComponentLink6URL: https://datasheet.ciiva.com/30090/smaj-30090141.pdf?src-supplier=Onlinecomponents.com; ComponentLink6Description: https://datasheet.ciiva.com/30090/smaj-30090141.pdf?src-supplier=Onlinecomponents.com; ComponentLink7URL: https://datasheet.ciiva.com/17413/smaj-17413550.pdf?; ComponentLink7Description: https://datasheet.ciiva.com/17413/smaj-17413550.pdf?
footprint DO-214AC, SMA
pins: 1 C, 2 A

## SMAJ6.0A
designator D?  (value not drawn)